# Altium footprint library KwantLib.PcbLib: 249 footprints (part 11 of 16)
Each footprint in its own frame and in the unit in brackets; x right, y up, seen from the top. Pads: shape width x height; smd on the part's side, far side on the other; paste and mask are expansions set on the pad; w line width, h text height; cw(c..) or ccw(c..) is an arc to the next point about the centre after c.
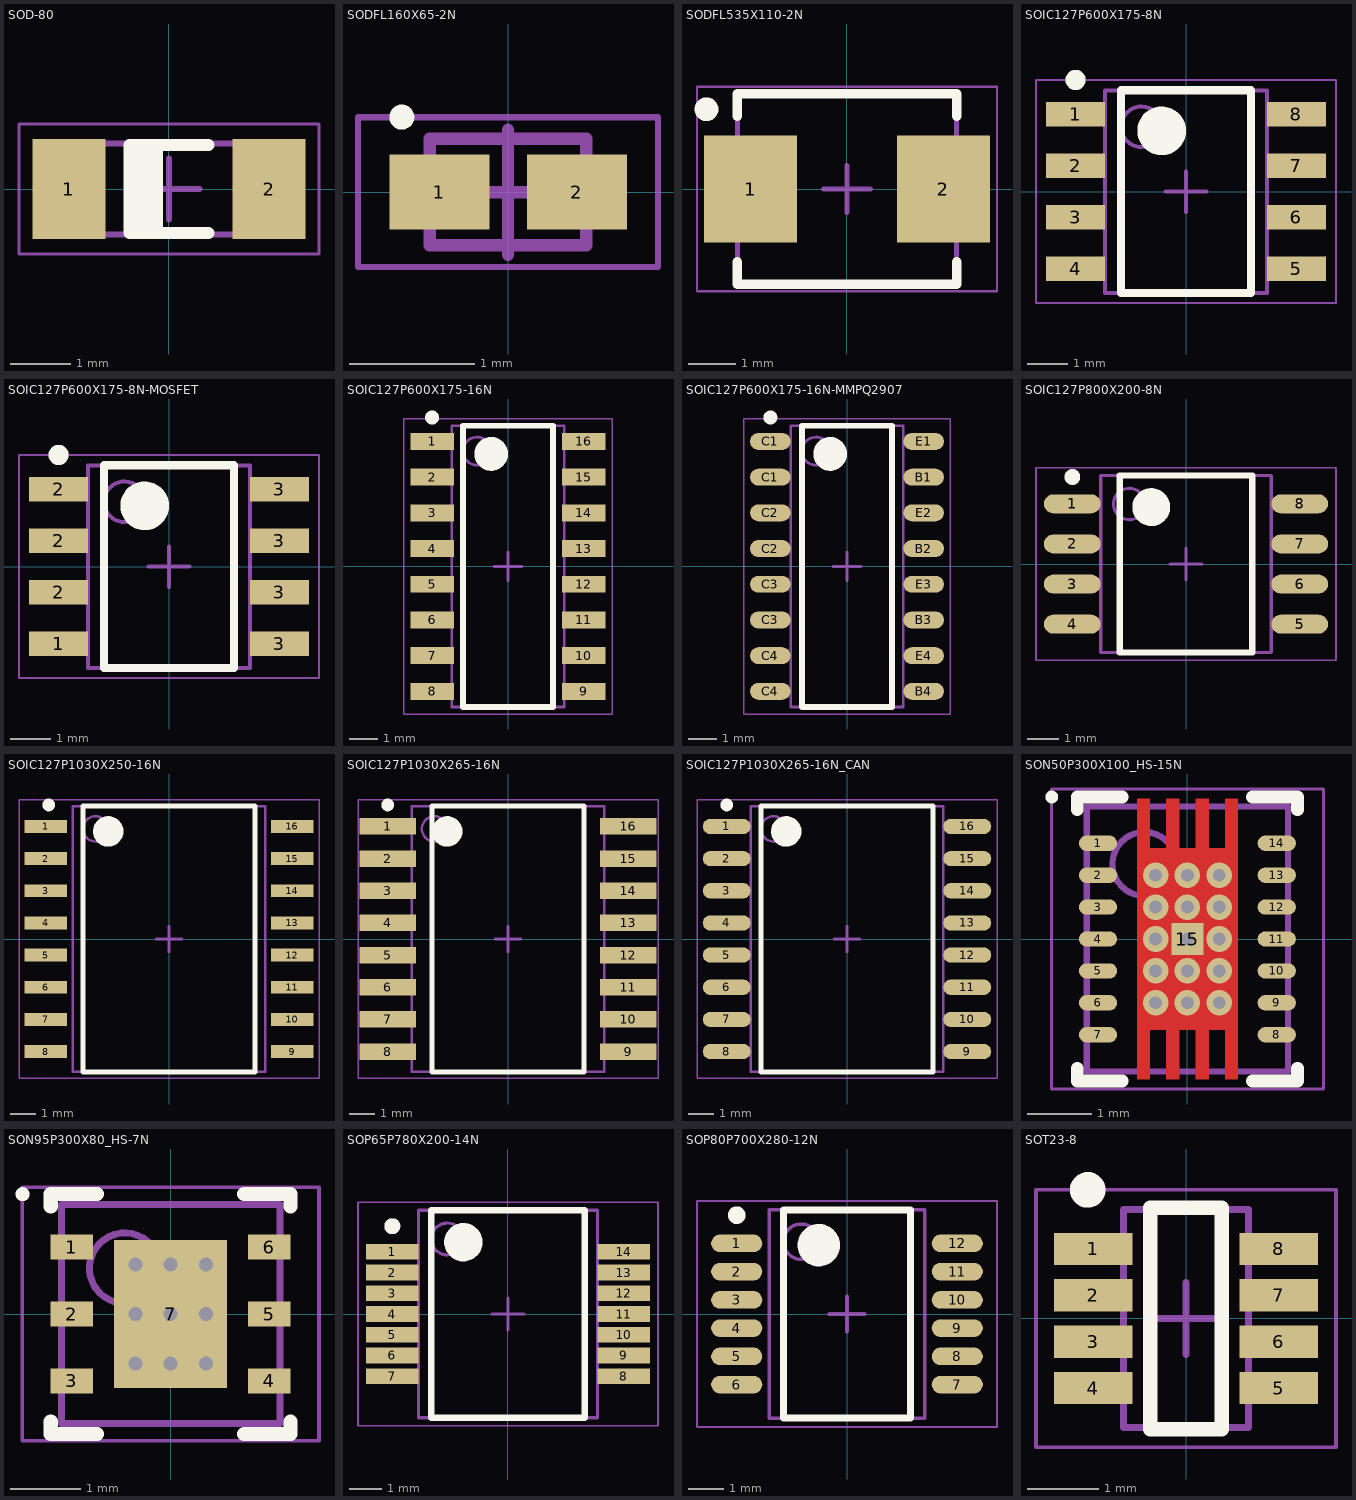
[diagram p10: the footprints below, top view; thin cyan lines are the x and y axes]

## SOD-80 [mm] "MELF Diode, 2-Leads, Body 3.45x1.40mm, IPC Medium Density"
height 1.5
pads (2):
  rect 1.2x1.65 smd: 1(-1.65,0) 2(1.65,0)
Top Overlay:
  rectangle: -0.65,-0.725 -0.1,0.725
  lines w0.2: 0.65,-0.725 -0.65,-0.725 -0.65,0.725 0.65,0.725
Mechanical 13:
  lines w0.1: -1.8,-0.75 -1.8,0.75 1.8,0.75 1.8,-0.75 -1.8,-0.75
Mechanical 15:
  lines w0.05: -2.475,-1.075 -2.475,1.075 2.475,1.075 2.475,-1.075 -2.475,-1.075
  lines w0.1: -0.5,0 0.5,0 ; 0,-0.5 0,0.5
3D body "DIOMELF3414N.step": height 1.4, standoff 0, extent -1.725,-0.7 1.725,0.7

## SODFL160X65-2N [mm] "SODFL, 2-Leads, Body 0.80x1.60mm, IPC Medium Density"
height 0.65
pads (2):
  rect 0.8x0.6 smd paste-0.05 mask+0.07: 1(-0.55,0) 2(0.55,0)
Top Overlay:
  circle w0.1: c-0.85,0.6 r0.05
Mechanical 13:
  lines w0.1: -0.625,-0.425 0.625,-0.425 0.625,0.425 -0.625,0.425 -0.625,-0.425
Mechanical 15:
  lines w0.05: -1.2,-0.6 1.2,-0.6 1.2,0.6 -1.2,0.6 -1.2,-0.6
  lines w0.1: -0.5,0 0.5,0 ; 0,-0.5 0,0.5
3D body "SODFL160X65-2N.step": height 0.65, standoff 0, extent -0.8,-0.425 0.8,0.425

## SODFL535X110-2N [mm] "SODFL, 2-Leads, Body 3.63x5.35mm, IPC Medium Density"
height 1.1
pads (2):
  rect 1.95x2.25 smd paste-0.07 mask+0.07: 1(-2.025,0) 2(2.025,0)
Top Overlay:
  circle w0.25: c-2.95,1.675 r0.125
  lines w0.2: -2.3,-1.525 -2.3,-2 2.3,-2 2.3,-1.525 ; -2.3,1.525 -2.3,2 2.3,2 2.3,1.525
Mechanical 13:
  lines w0.1: -2.3,-1.975 -2.3,1.975 2.3,1.975 2.3,-1.975 -2.3,-1.975
Mechanical 15:
  lines w0.05: -3.15,-2.15 -3.15,2.15 3.15,2.15 3.15,-2.15 -3.15,-2.15
  lines w0.1: -0.5,0 0.5,0 ; 0,-0.5 0,0.5
3D body "SODFL535X110-2N.step": height 1.1, standoff 0, extent -2.675,-1.975 2.675,1.975

## SOIC127P600X175-8N [mm] "SOIC, 8-Leads, Body 4.90x3.90mm, Pitch 1.27mm, IPC Medium Density"
height 1.75
pads (8):
  rect 1.45x0.6 smd paste-0.05: 1(-2.725,1.905) 2(-2.725,0.635) 3(-2.725,-0.635) 4(-2.725,-1.905) 5(2.725,-1.905) 6(2.725,-0.635) 7(2.725,0.635) 8(2.725,1.905)
Top Overlay:
  circle w0.25: c-2.725,2.755 r0.125
  circle w0.6: c-0.6,1.5 r0.3
  lines w0.2: -1.6,-2.5 -1.6,2.5 1.6,2.5 1.6,-2.5 -1.6,-2.5
Mechanical 13:
  circle w0.1: c-1.1,1.6 r0.5
  lines w0.1: -2,-2.5 -2,2.5 2,2.5 2,-2.5 -2,-2.5
Mechanical 15:
  lines w0.05: -3.7,-2.75 -3.7,2.75 3.7,2.75 3.7,-2.75 -3.7,-2.75
  lines w0.1: -0.5,0 0.5,0 ; 0,-0.5 0,0.5
3D body "SOIC127P600X175-8N.step": height 1.75, standoff 0, extent -3,-2.5 3,2.5

## SOIC127P600X175-8N-MOSFET [mm] "SOIC, 8-Leads, Body 4.90x3.90mm, Pitch 1.27mm, IPC Medium Density"
height 1.75
pads (8):
  rect 1.45x0.6 smd: 1(-2.725,-1.905) 2(-2.725,-0.635) 2(-2.725,0.635) 2(-2.725,1.905) 3(2.725,-1.905) 3(2.725,-0.635) 3(2.725,0.635) 3(2.725,1.905)
Top Overlay:
  circle w0.6: c-0.6,1.5 r0.3
  circle w0.25: c-2.725,2.755 r0.125
  lines w0.2: -1.6,-2.5 1.6,-2.5 1.6,2.5 -1.6,2.5 -1.6,-2.5
Mechanical 13:
  circle w0.1: c-1.1,1.6 r0.5
  lines w0.1: -2,-2.5 2,-2.5 2,2.5 -2,2.5 -2,-2.5
Mechanical 15:
  lines w0.05: -3.7,-2.75 3.7,-2.75 3.7,2.75 -3.7,2.75 -3.7,-2.75
  lines w0.1: -0.5,0 0.5,0 ; 0,-0.5 0,0.5
3D body "SOIC127P600X175-8N.step": height 1.75, standoff 0, extent -3,-2.5 3,2.5

## SOIC127P600X175-16N [mm] "SOIC, 16-Leads, Body 9.90x3.90mm, Pitch 1.27mm, IPC Medium Density"
height 1.75
pads (16):
  rect 1.55x0.6 smd paste-0.05 mask+0.07: 1(-2.7,4.445) 2(-2.7,3.175) 3(-2.7,1.905) 4(-2.7,0.635) 5(-2.7,-0.635) 6(-2.7,-1.905) 7(-2.7,-3.175) 8(-2.7,-4.445) 9(2.7,-4.445) 10(2.7,-3.175) 11(2.7,-1.905) 12(2.7,-0.635) 13(2.7,0.635) 14(2.7,1.905) 15(2.7,3.175) 16(2.7,4.445)
Top Overlay:
  circle w0.6: c-0.6,4 r0.3
  circle w0.25: c-2.7,5.295 r0.125
  lines w0.2: -1.6,-5 1.6,-5 1.6,5 -1.6,5 -1.6,-5
Mechanical 13:
  circle w0.1: c-1.1,4.1 r0.5
  lines w0.1: -2,-5 2,-5 2,5 -2,5 -2,-5
Mechanical 15:
  lines w0.05: -3.7,-5.25 3.7,-5.25 3.7,5.25 -3.7,5.25 -3.7,-5.25
  lines w0.1: -0.5,0 0.5,0 ; 0,-0.5 0,0.5
3D body "SOIC127P600X175-16N.step": height 1.75, standoff 0, extent -3,-5 3,5

## SOIC127P600X175-16N-MMPQ2907 [mm] "SOIC, 16-Leads, Body 10,00x3,90mm, Pitch 1,27mm, IPC Medium Density"
height 1.75
pads (16):
  oval 1.45x0.6 smd: B1(2.725,3.175) B2(2.725,0.635) B3(2.725,-1.905) B4(2.725,-4.445) C1(-2.725,3.175) C1(-2.725,4.445) C2(-2.725,0.635) C2(-2.725,1.905) C3(-2.725,-1.905) C3(-2.725,-0.635) C4(-2.725,-4.445) C4(-2.725,-3.175) E1(2.725,4.445) E2(2.725,1.905) E3(2.725,-0.635) E4(2.725,-3.175)
Top Overlay:
  circle w0.6: c-0.6,4 r0.3
  circle w0.25: c-2.725,5.295 r0.125
  lines w0.2: -1.6,-5 1.6,-5 1.6,5 -1.6,5 -1.6,-5
Mechanical 13:
  circle w0.1: c-1.1,4.1 r0.5
  lines w0.1: -2,-5 2,-5 2,5 -2,5 -2,-5
Mechanical 15:
  lines w0.05: -3.675,-5.25 3.675,-5.25 3.675,5.25 -3.675,5.25 -3.675,-5.25
  lines w0.1: -0.5,0 0.5,0 ; 0,-0.5 0,0.5
3D body "SOIC127P600X175-16N-MMPQ2907.step": height 1.75, standoff 0, extent -3,-5 3,5

## SOIC127P800X200-8N [mm] "SOIC, 8-Leads, Body 5.34x5.29mm, Pitch 1.27mm, IPC Medium Density"
height 2
pads (8):
  oval 1.8x0.6 smd: 1(-3.6,1.905) 2(-3.6,0.635) 3(-3.6,-0.635) 4(-3.6,-1.905) 5(3.6,-1.905) 6(3.6,-0.635) 7(3.6,0.635) 8(3.6,1.905)
Top Overlay:
  circle w0.25: c-3.6,2.755 r0.125
  circle w0.6: c-1.1,1.8 r0.3
  lines w0.2: -2.1,-2.8 -2.1,2.8 2.1,2.8 2.1,-2.8 -2.1,-2.8
Mechanical 13:
  circle w0.1: c-1.8,1.9 r0.5
  lines w0.1: -2.7,-2.8 -2.7,2.8 2.7,2.8 2.7,-2.8 -2.7,-2.8
Mechanical 15:
  lines w0.05: -4.75,-3.05 -4.75,3.05 4.75,3.05 4.75,-3.05 -4.75,-3.05
  lines w0.1: -0.5,0 0.5,0 ; 0,-0.5 0,0.5
3D body "SOIC127P800X200-8N.step": height 2, standoff 0, extent -3.99,-2.8 3.99,2.8

## SOIC127P1030X250-16N [mm] "SOIC, 16-Leads, Body 10.29x7.50mm, Pitch 1.27mm, IPC Medium Density"
height 2.5
pads (16):
  rect 1.675x0.51 smd: 1(-4.862,4.445) 2(-4.862,3.175) 3(-4.862,1.905) 4(-4.862,0.635) 5(-4.862,-0.635) 6(-4.862,-1.905) 7(-4.862,-3.175) 8(-4.862,-4.445) 9(4.862,-4.445) 10(4.862,-3.175) 11(4.862,-1.905) 12(4.862,-0.635) 13(4.862,0.635) 14(4.862,1.905) 15(4.862,3.175) 16(4.862,4.445)
Top Overlay:
  circle w0.25: c-4.75,5.295 r0.125
  circle w0.6: c-2.4,4.25 r0.3
  lines w0.2: -3.4,-5.25 -3.4,5.25 3.4,5.25 3.4,-5.25 -3.4,-5.25
Mechanical 13:
  circle w0.1: c-2.9,4.35 r0.5
  lines w0.1: -3.8,-5.25 -3.8,5.25 3.8,5.25 3.8,-5.25 -3.8,-5.25
Mechanical 15:
  lines w0.05: -5.925,-5.5 -5.925,5.5 5.925,5.5 5.925,-5.5 -5.925,-5.5
  lines w0.1: -0.5,0 0.5,0 ; 0,-0.5 0,0.5
3D body "SOIC127P1030X250-16N.step": height 2.5, standoff 0, extent -5.16,-5.25 5.16,5.25

## SOIC127P1030X265-16N [mm] "SOIC, 16-Leads, Body 10.30x7.50mm, Pitch 1.27mm, IPC Medium Density"
height 2.65
pads (16):
  rect 2.25x0.65 smd: 1(-4.75,4.445) 2(-4.75,3.175) 3(-4.75,1.905) 4(-4.75,0.635) 5(-4.75,-0.635) 6(-4.75,-1.905) 7(-4.75,-3.175) 8(-4.75,-4.445) 9(4.75,-4.445) 10(4.75,-3.175) 11(4.75,-1.905) 12(4.75,-0.635) 13(4.75,0.635) 14(4.75,1.905) 15(4.75,3.175) 16(4.75,4.445)
Top Overlay:
  circle w0.25: c-4.75,5.295 r0.125
  circle w0.6: c-2.4,4.25 r0.3
  lines w0.2: -3,-5.25 -3,5.25 3,5.25 3,-5.25 -3,-5.25
Mechanical 13:
  circle w0.1: c-2.9,4.35 r0.5
  lines w0.1: -3.8,-5.25 -3.8,5.25 3.8,5.25 3.8,-5.25 -3.8,-5.25
Mechanical 15:
  lines w0.05: -5.925,-5.5 -5.925,5.5 5.925,5.5 5.925,-5.5 -5.925,-5.5
  lines w0.1: -0.5,0 0.5,0 ; 0,-0.5 0,0.5
3D body "SOIC127P1030X265-16N.step": height 2.65, standoff 0, extent -5.15,-5.25 5.15,5.25

## SOIC127P1030X265-16N_CAN [mm] "SOIC, 16-Leads, Body 10.30x7.50mm, Pitch 1.27mm, IPC Medium Density"
height 2.65
pads (16):
  oval 1.9x0.6 smd paste-0.03 mask+0.07: 1(-4.75,4.445) 2(-4.75,3.175) 3(-4.75,1.905) 4(-4.75,0.635) 5(-4.75,-0.635) 6(-4.75,-1.905) 7(-4.75,-3.175) 8(-4.75,-4.445) 9(4.75,-4.445) 10(4.75,-3.175) 11(4.75,-1.905) 12(4.75,-0.635) 13(4.75,0.635) 14(4.75,1.905) 15(4.75,3.175) 16(4.75,4.445)
Top Overlay:
  circle w0.25: c-4.75,5.295 r0.125
  circle w0.6: c-2.4,4.25 r0.3
  lines w0.2: -3.4,-5.25 -3.4,5.25 3.4,5.25 3.4,-5.25 -3.4,-5.25
Mechanical 13:
  circle w0.1: c-2.9,4.35 r0.5
  lines w0.1: -3.8,-5.25 -3.8,5.25 3.8,5.25 3.8,-5.25 -3.8,-5.25
Mechanical 15:
  lines w0.05: -5.925,-5.5 -5.925,5.5 5.925,5.5 5.925,-5.5 -5.925,-5.5
  lines w0.1: -0.5,0 0.5,0 ; 0,-0.5 0,0.5
3D body "SOIC127P1030X265-16N_2.step": height 2.65, standoff 0, extent -5.162,-5.25 5.162,5.25

## SON50P300X100_HS-15N [mm] "SON, 14-Leads, Body 4.00x3.00mm, Pitch 0.50mm, Thermal Pad 2.85x1.44mm, IPC Medium Density"
height 1
pads (15):
  oval 0.6x0.24 smd mask+0.07: 1(-1.4,1.5) 2(-1.4,1) 3(-1.4,0.5) 4(-1.4,0) 5(-1.4,-0.5) 6(-1.4,-1) 7(-1.4,-1.5) 8(1.4,-1.5) 9(1.4,-1) 10(1.4,-0.5) 11(1.4,0) 12(1.4,0.5) 13(1.4,1) 14(1.4,1.5)
  rect 0.5x0.5 smd paste-1: 15(0,0)
via 0,0 diameter 0.4 hole 0.2
via 0,0.5 diameter 0.4 hole 0.2
via 0,1 diameter 0.4 hole 0.2
via 0,-0.5 diameter 0.4 hole 0.2
via 0,-1 diameter 0.4 hole 0.2
via -0.5,-1 diameter 0.4 hole 0.2
via -0.5,-0.5 diameter 0.4 hole 0.2
via -0.5,0 diameter 0.4 hole 0.2
via -0.5,0.5 diameter 0.4 hole 0.2
via -0.5,1 diameter 0.4 hole 0.2
via 0.5,1 diameter 0.4 hole 0.2
via 0.5,0.5 diameter 0.4 hole 0.2
via 0.5,0 diameter 0.4 hole 0.2
via 0.5,-0.5 diameter 0.4 hole 0.2
via 0.5,-1 diameter 0.4 hole 0.2
Top Layer:
  region: -0.79,-2.2 -0.59,-2.2 -0.59,-1.425 -0.33,-1.425 -0.33,-2.2 -0.13,-2.2 -0.13,-1.425 0.13,-1.425 0.13,-2.2 0.33,-2.2 0.33,-1.425 0.59,-1.425 0.59,-2.2 0.79,-2.2 0.79,2.2 0.59,2.2 0.59,1.425 0.33,1.425 0.33,2.2 0.13,2.2 0.13,1.425 -0.13,1.425 -0.13,2.2 -0.33,2.2 -0.33,1.425 -0.59,1.425 -0.59,2.2 -0.79,2.2
Top Overlay:
  circle w0.1: c-2.125,2.225 r0.05
  lines w0.2: -1.725,-2.025 -1.725,-2.225 -1.02,-2.225 ; -1.725,2.025 -1.725,2.225 -1.02,2.225 ; 1.02,-2.225 1.725,-2.225 1.725,-2.025 ; 1.02,2.225 1.725,2.225 1.725,2.025
Top Paste:
  region: -0.79,0.1 -0.79,2.2 -0.59,2.2 -0.59,1.35 -0.33,1.35 -0.33,2.2 -0.13,2.2 -0.13,0.1
  region: 0.13,0.1 0.13,2.2 0.33,2.2 0.33,1.35 0.59,1.35 0.59,2.2 0.79,2.2 0.79,0.1
  region: 0.13,-2.2 0.13,-0.1 0.79,-0.1 0.79,-2.2 0.59,-2.2 0.59,-1.35 0.33,-1.35 0.33,-2.2
  region: -0.79,-2.2 -0.79,-0.1 -0.13,-0.1 -0.13,-2.2 -0.33,-2.2 -0.33,-1.35 -0.59,-1.35 -0.59,-2.2
Mechanical 13:
  circle w0.1: c-0.675,1.175 r0.5
  lines w0.1: -1.575,-2.075 -1.575,2.075 1.575,2.075 1.575,-2.075 -1.575,-2.075
Mechanical 15:
  lines w0.05: -2.13,-2.35 -2.13,2.35 2.13,2.35 2.13,-2.35 -2.13,-2.35
  lines w0.1: -0.5,0 0.5,0 ; 0,-0.5 0,0.5
3D body "SON50P300X100_HS-15N.step": height 1, standoff 0, extent -1.675,-2.075 1.675,2.075

## SON95P300X80_HS-7N [mm] "SON, 6-Leads, Body 3.00x3.00mm, Pitch 0.95mm, Thermal Pad 2.10x1.49mm, IPC Medium Density"
height 0.8
pads (7):
  rect 0.6x0.35 smd paste-0.03 mask+0.07: 1(-1.4,0.95) 2(-1.4,0) 3(-1.4,-0.95) 4(1.4,-0.95) 5(1.4,0) 6(1.4,0.95)
  rect 1.6x2.1 smd paste-0.06 mask+0.07: 7(0,0)
via 0.5,0.7 diameter 0.4 hole 0.2
via 0,0.7 diameter 0.4 hole 0.2
via -0.5,0.7 diameter 0.4 hole 0.2
via 0.5,-0.7 diameter 0.4 hole 0.2
via 0,-0.7 diameter 0.4 hole 0.2
via -0.5,-0.7 diameter 0.4 hole 0.2
via 0.5,0 diameter 0.4 hole 0.2
via 0,0 diameter 0.4 hole 0.2
via -0.5,0 diameter 0.4 hole 0.2
Top Overlay:
  circle w0.1: c-2.1,1.7 r0.05
  lines w0.2: -1.7,-1.525 -1.7,-1.7 -1.045,-1.7 ; -1.7,1.525 -1.7,1.7 -1.045,1.7 ; 1.045,-1.7 1.7,-1.7 1.7,-1.525 ; 1.045,1.7 1.7,1.7 1.7,1.525
Mechanical 13:
  circle w0.1: c-0.65,0.65 r0.5
  lines w0.1: -1.55,-1.55 -1.55,1.55 1.55,1.55 1.55,-1.55 -1.55,-1.55
Mechanical 15:
  lines w0.05: -2.105,-1.8 -2.105,1.8 2.105,1.8 2.105,-1.8 -2.105,-1.8
  lines w0.1: -0.5,0 0.5,0 ; 0,-0.5 0,0.5
3D body "SON95P300X80_HS-7N.step": height 0.8, standoff 0, extent -1.65,-1.55 1.65,1.55

## SOP65P780X200-14N [mm] "SOP, 14-Leads, Body 6.20x5.30mm, Pitch 0.65mm, IPC Medium Density"
height 2
pads (14):
  rect 1.65x0.5 smd mask+0.07: 1(-3.625,1.95) 2(-3.625,1.3) 3(-3.625,0.65) 4(-3.625,0) 5(-3.625,-0.65) 6(-3.625,-1.3) 7(-3.625,-1.95) 8(3.625,-1.95) 9(3.625,-1.3) 10(3.625,-0.65) 11(3.625,0) 12(3.625,0.65) 13(3.625,1.3) 14(3.625,1.95)
Top Overlay:
  circle w0.6: c-1.4,2.25 r0.3
  circle w0.25: c-3.625,2.75 r0.125
  lines w0.2: -2.4,-3.25 2.4,-3.25 2.4,3.25 -2.4,3.25 -2.4,-3.25
Mechanical 13:
  circle w0.1: c-1.9,2.35 r0.5
  lines w0.1: -2.8,-3.25 2.8,-3.25 2.8,3.25 -2.8,3.25 -2.8,-3.25
Mechanical 15:
  lines w0.05: -4.7,-3.5 4.7,-3.5 4.7,3.5 -4.7,3.5 -4.7,-3.5
  lines w0.1: -0.5,0 0.5,0 ; 0,-0.5 0,0.5
3D body "SOP65P780X200-14N.step": height 2, standoff 0, extent -3.9,-3.25 3.9,3.25

## SOP80P700X280-12N [mm] "SOP, 12-Leads, Body 5.60x4.40mm, Pitch 0.80mm, IPC Medium Density"
height 2.8
pads (12):
  oval 1.45x0.5 smd paste-0.05: 1(-3.125,2) 2(-3.125,1.2) 3(-3.125,0.4) 4(-3.125,-0.4) 5(-3.125,-1.2) 6(-3.125,-2) 7(3.125,-2) 8(3.125,-1.2) 9(3.125,-0.4) 10(3.125,0.4) 11(3.125,1.2) 12(3.125,2)
Top Overlay:
  circle w0.6: c-0.8,1.95 r0.3
  circle w0.25: c-3.125,2.8 r0.125
  lines w0.2: -1.8,-2.95 1.8,-2.95 1.8,2.95 -1.8,2.95 -1.8,-2.95
Mechanical 13:
  circle w0.1: c-1.3,2.05 r0.5
  lines w0.1: -2.2,-2.95 2.2,-2.95 2.2,2.95 -2.2,2.95 -2.2,-2.95
Mechanical 15:
  lines w0.05: -4.25,-3.2 4.25,-3.2 4.25,3.2 -4.25,3.2 -4.25,-3.2
  lines w0.1: -0.5,0 0.5,0 ; 0,-0.5 0,0.5
3D body "SOP80P700X280-12N.step": height 2.8, standoff 0, extent -3.5,-2.95 3.5,2.95

## SOT23-8 [mm] "SOT23, 8-Leads, Body 2.90x2.80mm, Pitch 0.65mm, IPC Medium Density"
height 1.45
pads (8):
  rect 1.1x0.45 smd paste-0.05 mask+0.07: 1(-1.3,0.975) 2(-1.3,0.325) 3(-1.3,-0.325) 4(-1.3,-0.975) 5(1.3,-0.975) 6(1.3,-0.325) 7(1.3,0.325) 8(1.3,0.975)
Top Overlay:
  circle w0.25: c-1.375,1.8 r0.125
  lines w0.2: -0.5,-1.55 0.5,-1.55 0.5,1.55 -0.5,1.55 -0.5,-1.55
Mechanical 13:
  lines w0.1: -0.875,-1.525 -0.875,1.525 0.875,1.525 0.875,-1.525 -0.875,-1.525
Mechanical 15:
  lines w0.05: -2.1,-1.8 -2.1,1.8 2.1,1.8 2.1,-1.8 -2.1,-1.8
  lines w0.1: -0.5,0 0.5,0 ; 0,-0.5 0,0.5
3D body "User Library-sot238.step": height 1.2, standoff 0, extent -1.4,-1.47 1.4,1.47